# Altium footprint library LUMI_Standard_Auto_Soldering_LIB.PcbLib: 344 footprints (part 5 of 22)
Each footprint in its own frame and in the unit in brackets; x right, y up, seen from the top. Pads: shape width x height; smd on the part's side, far side on the other; paste and mask are expansions set on the pad; w line width, h text height; cw(c..) or ccw(c..) is an arc to the next point about the centre after c.
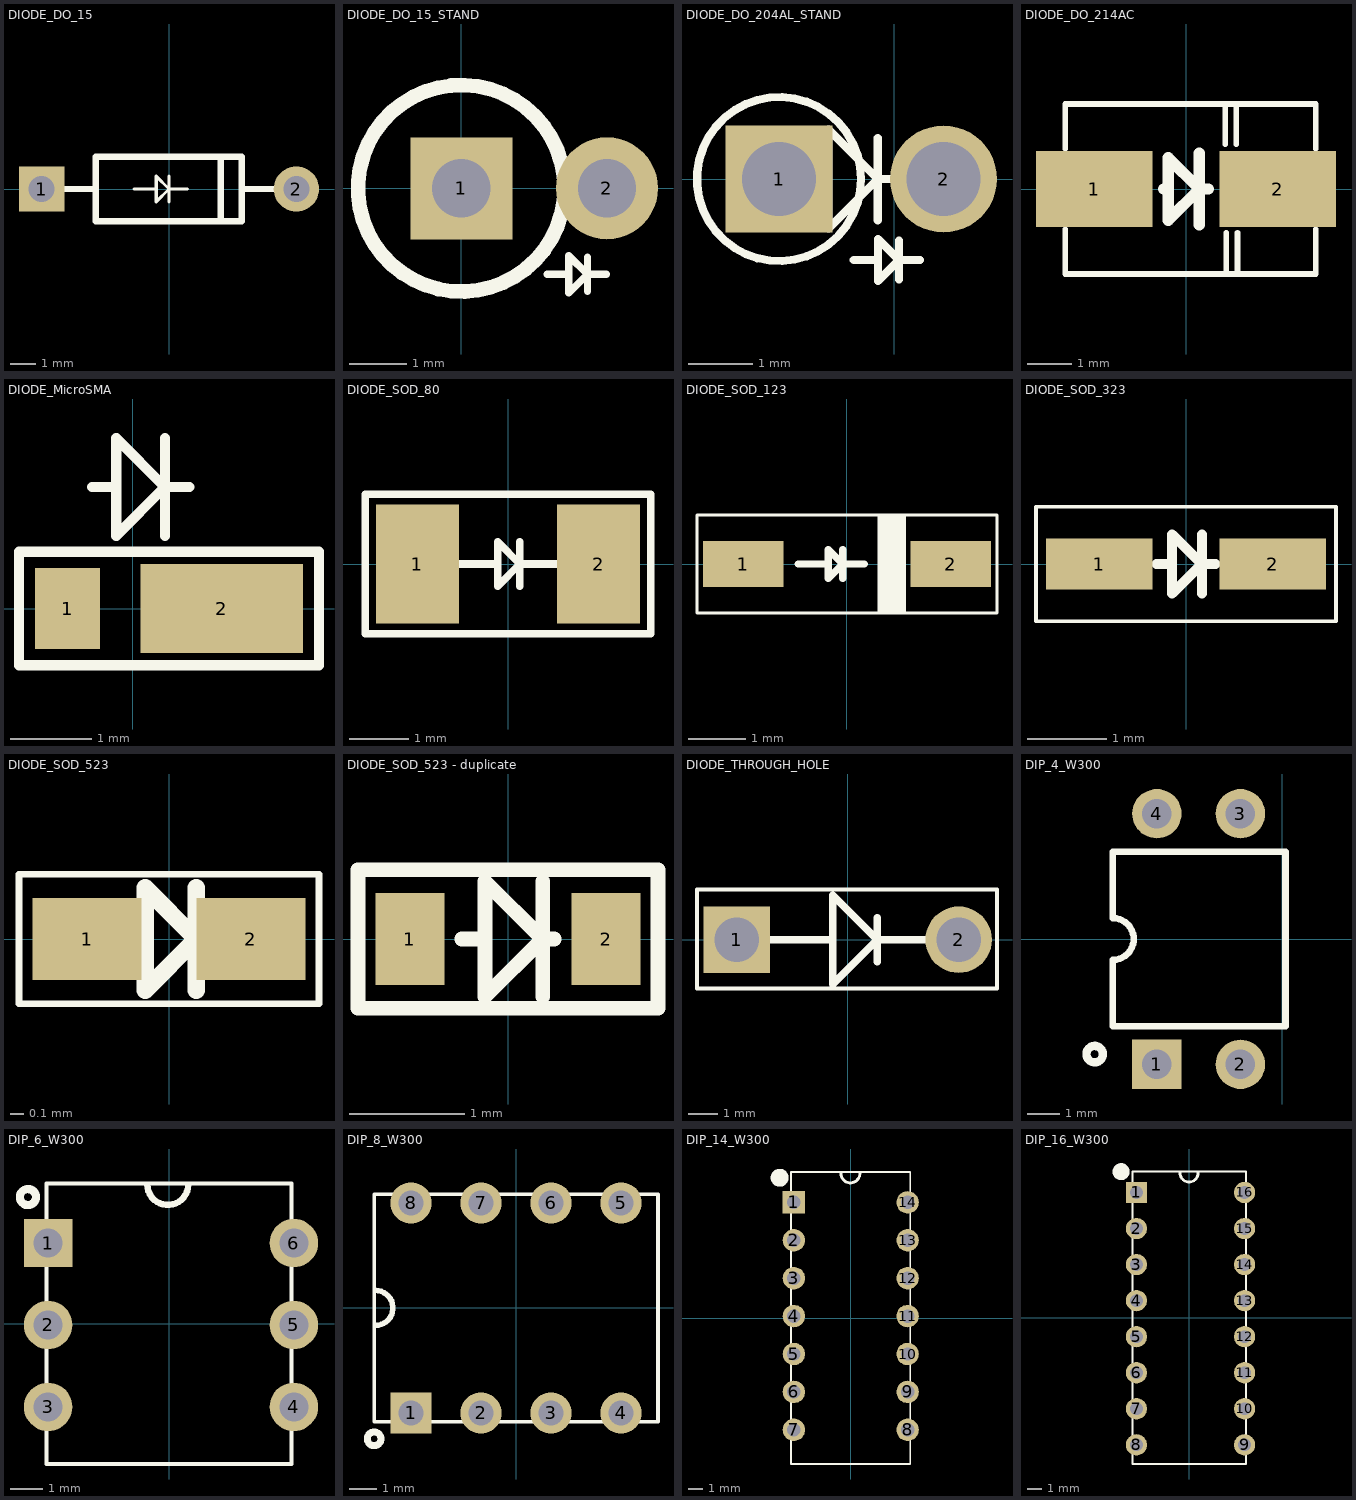
[diagram p4: the footprints below, top view; thin cyan lines are the x and y axes]

## DIODE_DO_15 [mil]
pads (2):
  rect 70x70 hole 40: 1(-196.85,0)
  round 70 hole 40: 2(196.85,0)
Top Overlay:
  lines w5: -54.13,0 -19.69,0 ; 0,-19.68 0,19.68 ; 28.54,0 0,0 ; -19.68,-19.68 0,0 ; -19.69,-19.68 -19.68,-19.68 ; -19.69,-19.68 -19.69,19.68 0,0 ; 0,0 0,0
  lines w10: -196.85,0 -113.19,0 ; 79.96,-50 79.96,50 ; 112.2,0 196.85,0 ; -113.19,-50 112.2,-50 112.2,50 -113.19,50 -113.19,-50

## DIODE_DO_15_STAND [mil]
pads (2):
  rect 70x70 hole 40: 1(0,0)
  round 70 hole 40: 2(100,0)
Top Overlay:
  circle w10: c0,0 r70.87
  lines w5: 59.06,-59.06 73.82,-59.06 ; 86.61,-70.87 86.61,-47.24 ; 99.41,-59.06 86.61,-59.06 ; 86.61,-59.06 73.82,-46.26 73.82,-71.85 86.61,-59.06
3D body: height 435.04, standoff -157.48, extent -70.07,-70.07 116.93,70.09

## DIODE_DO_204AL_STAND [mil]
pads (2):
  rect 65x65 hole 45: 1(-70,0)
  round 65 hole 45: 2(30,0)
Top Overlay:
  circle w5: c-70,0 r49.88
  lines w5: -70,0 -40,0 ; -24.61,-49.21 -9.84,-49.21 ; -10,-25 -10,25 ; 2.95,-61.02 2.95,-37.4 ; 15.75,-49.21 2.95,-49.21 ; 30,0 -10,0 ; -10,0 -40,30 -40,-30 -10,0 ; 2.95,-49.21 -9.84,-62.01 -9.84,-36.42 2.95,-49.21
3D body: height 280.46, standoff -50, extent -123,-55 45,50

## DIODE_DO_214AC [mm]
pads (2):
  rect 2.6x1.7 smd: 1(-2.05,0) 2(2.05,0)
Top Overlay:
  lines w0.127: -2.7,-0.9 -2.7,-1.9 2.9,-1.9 2.9,-0.9 ; -2.7,0.9 -2.7,1.9 2.9,1.9 2.9,0.9 ; -0.4,-0.7 0.3,0 -0.4,0.7 ; 0.875,1 0.875,1.9 ; 0.9,-1.9 0.9,-0.975 ; 1.125,1 1.125,1.9 ; 1.15,-1.9 1.15,-0.975
  lines w0.254: -0.5,0 -0.4,0 ; 0.3,-0.8 0.3,0.8 ; 0.5,0 0.3,0 ; 0.3,0 -0.4,-0.7 -0.4,0.7 0.3,0
3D body: height 2.4, standoff 0.1, extent -2.6,-1.8 2.8,1.8

## DIODE_MicroSMA [mm]
pads (2):
  rect 0.8x1 smd: 1(-0.8,0)
  rect 2x1.1 smd: 2(1.1,0)
Top Overlay:
  lines w0.127: -0.5,1.5 -0.2,1.5 ; 0.4,0.9 0.4,2.1 ; 0.7,1.5 0.4,1.5 ; -0.2,1.5 -0.2,2.1 0.4,1.5 ; -0.2,1.5 -0.2,0.9 0.4,1.5 ; -1.4,-0.7 -1.4,0.7 2.3,0.7 2.3,-0.7 -1.4,-0.7
3D body: height 0.74, standoff 0, extent 0.7,-0.6 0.9,0.6
3D body: height 0.1, standoff 0, extent -1.15,-0.4 -1.05,0.4
3D body: height 0.1, standoff 0, extent 1.05,-0.5 1.15,0.5
3D body: height 0.73, standoff 0, extent -1.05,-0.6 1.05,0.6

## DIODE_SOD_80 [mm] "Use for diode"
pads (2):
  rect 1.4x2 smd: 1(-1.524,0) 2(1.524,0)
Top Overlay:
  lines w0.127: -0.875,0 -0.175,0 ; 0.2,-0.375 0.2,0.375 ; 0.85,0 0.2,0 ; -0.175,0 -0.175,-0.375 0.2,0 ; -0.175,0 -0.175,0.375 0.2,0 ; -2.4,-1.175 -2.4,1.175 2.4,1.175 2.4,-1.175 -2.4,-1.175
3D body: height -0.39, standoff -1.84, extent -1.75,-0.725 1.75,0.725

## DIODE_SOD_123 [mm]
pads (2):
  rect 1.4x0.8 smd: 1(-1.8,0) 2(1.8,0)
Top Overlay:
  rectangle: 0.525,-0.85 1.025,0.825
  lines w0.05: -2.6,-0.85 -2.6,0.85 2.6,0.85 2.6,-0.85 -2.6,-0.85
  lines w0.127: -0.85,0 -0.325,0 ; -0.075,-0.25 -0.075,0.25 ; 0.3,0 -0.075,0 ; -0.075,0 -0.325,0.25 -0.325,-0.25 -0.075,0
3D body: height -0.46, standoff -1.73, extent -1.85,-0.8 1.85,0.8

## DIODE_SOD_323 [mm]
pads (2):
  rect 1.35x0.65 smd: 1(-1.1,0) 2(1.1,0)
Top Overlay:
  lines w0.05: -1.9,-0.725 1.9,-0.725 1.9,0.725 -1.9,0.725 -1.9,-0.725
  lines w0.127: -0.375,0 -0.175,0 ; 0.2,-0.375 0.2,0.375 ; 0.375,0 0.2,0 ; -0.175,0 -0.175,0.375 0.2,0 ; -0.175,0 -0.175,-0.375 0.2,0
3D body: height -0.41, standoff -1.51, extent -1.3,-0.675 1.3,0.675

## DIODE_SOD_523 [mm]
pads (2):
  rect 0.8x0.6 smd: 1(-0.6,0) 2(0.6,0)
Top Overlay:
  lines w0.05: -1.1,-0.475 -1.1,0.475 1.1,0.475 1.1,-0.475 -1.1,-0.475
  lines w0.127: -0.375,0 -0.175,0 ; 0.2,-0.375 0.2,0.375 ; 0.375,0 0.2,0 ; -0.175,0 -0.175,0.375 0.2,0 ; -0.175,0 -0.175,-0.375 0.2,0
3D body: height 0.2, standoff 0, extent 0.65,-0.125 0.9,0.125
3D body: height 0.2, standoff 0, extent -0.9,-0.125 -0.65,0.125
3D body: height 0.77, standoff 0, extent -0.65,-0.45 0.65,0.45
3D body: height 0.78, standoff 0, extent 0.425,-0.4 0.5,0.4

## DIODE_SOD_523 - duplicate [mm]
pads (2):
  rect 0.6x0.8 smd: 1(-0.85,0) 2(0.85,0)
Top Overlay:
  lines w0.127: -0.4,0 -0.2,0 ; 0.3,-0.5 0.3,0 ; 0.3,0.5 0.3,0 ; 0.4,0 0.3,0 ; -0.2,0 -0.2,0.5 0.3,0 ; -0.2,0 -0.2,-0.5 0.3,0 ; -1.3,-0.6 1.3,-0.6 1.3,0.6 -1.3,0.6 -1.3,-0.6
3D body: height 0.2, standoff 0, extent 0.65,-0.125 0.9,0.125
3D body: height 0.2, standoff 0, extent -0.9,-0.125 -0.65,0.125
3D body: height 0.77, standoff 0, extent -0.65,-0.45 0.65,0.45
3D body: height 0.78, standoff 0, extent 0.425,-0.4 0.5,0.4

## DIODE_THROUGH_HOLE [mil]
pads (2):
  rect 90x90 hole 60: 1(-150,0)
  round 90 hole 60: 2(150,0)
Top Overlay:
  lines w5: -203.74,-65.94 201.77,-65.94 201.77,67.91 -203.74,67.91 -203.74,-65.94
  lines w10: -140,0 -20,0 ; 40,-30 40,30 ; 150,0 40,0 ; 40,0 -20,60 -20,-60 40,0
3D body: height 125.98, standoff -133.86, extent -165.75,-61.98 165.75,64

## DIP_4_W300 [mm] "DIP; 8 Leads; Row Spacing 7.62 mm; Pitch 2.54 mm"
height 5.08
pads (4):
  rect 1.5x1.5 hole 0.9: 1(-3.81,-3.81)
  round 1.5 hole 0.9: 2(-1.27,-3.81) 3(-1.27,3.81) 4(-3.81,3.81)
Top Overlay:
  circle w0.254: c-5.7,-3.5 r0.25
  lines w0.2: -5.15,-2.65 -5.15,-0.635 ccw(c-5.15,0) -5.15,0.635 -5.15,2.65 0.102,2.65 0.102,-2.65 -5.15,-2.65
3D body: height 4.31, standoff -3.28, extent -5.258,-3.949 0.282,4.051

## DIP_6_W300 [mm]
pads (6):
  rect 1.5x1.5 hole 0.9: 1(-3.75,2.5)
  round 1.5 hole 0.9: 2(-3.75,-0.04) 3(-3.75,-2.58) 4(3.87,-2.58) 5(3.87,-0.04) 6(3.87,2.5)
Top Overlay:
  circle w0.254: c-4.375,3.925 r0.25
  lines w0.127: -3.8,-4.35 -3.8,4.35 3.8,4.35 3.8,-4.35 -3.8,-4.35
  lines w0.2: -0.675,4.315 ccw(c-0.04,4.315) 0.595,4.315
3D body: height 5.3, standoff -2, extent -3.935,-3.62 3.935,3.5

## DIP_8_W300 [mm] "DIP; 8 Leads; Row Spacing 7.62 mm; Pitch 2.54 mm"
height 5.08
pads (8):
  rect 1.5x1.5 hole 0.9: 1(-3.81,-3.81)
  round 1.5 hole 0.9: 2(-1.27,-3.81) 3(1.27,-3.81) 4(3.81,-3.81) 5(3.81,3.81) 6(1.27,3.81) 7(-1.27,3.81) 8(-3.81,3.81)
Top Overlay:
  circle w0.254: c-5.15,-4.75 r0.25
  lines w0.127: -5.15,-4.13 5.15,-4.13 5.15,4.13 -5.15,4.13 -5.15,-4.13
  lines w0.2: -5.1,-0.635 ccw(c-5.1,0) -5.1,0.635
3D body: height 5.08, standoff -3.5, extent -5.638,-3.96 5.282,3.91

## DIP_14_W300 [mm] "DIP, 40-Leads, Row Spacing 15.24mm, Pitch 2.54mm, Body 51.8x13.5mm"
height 6.35
pads (14):
  rect 1.5x1.5 hole 0.9: 1(-3.795,7.75)
  round 1.5 hole 0.9: 2(-3.795,5.21) 3(-3.795,2.67) 4(-3.795,0.13) 5(-3.795,-2.41) 6(-3.795,-4.95) 7(-3.795,-7.49) 8(3.825,-7.49) 9(3.825,-4.95) 10(3.825,-2.41) 11(3.825,0.13) 12(3.825,2.67) 13(3.825,5.21) 14(3.825,7.75)
Top Overlay:
  circle w0.6: c-4.75,9.4 r0.3
  lines w0.127: -4,-9.78 4,-9.78 4,9.78 -4,9.78 -4,-9.78
  lines w0.2: -0.645,9.685 ccw(c-0.01,9.685) 0.625,9.685
3D body: height 5.1, standoff -3.3, extent -3.91,-10 3.96,10

## DIP_16_W300 [mm] "DIP, 40-Leads, Row Spacing 15.24mm, Pitch 2.54mm, Body 51.8x13.5mm"
height 6.35
pads (16):
  rect 1.5x1.5 hole 0.9: 1(-3.72,8.83)
  round 1.5 hole 0.9: 2(-3.72,6.29) 3(-3.72,3.75) 4(-3.72,1.21) 5(-3.72,-1.33) 6(-3.72,-3.87) 7(-3.72,-6.41) 8(-3.72,-8.95) 9(3.9,-8.95) 10(3.9,-6.41) 11(3.9,-3.87) 12(3.9,-1.33) 13(3.9,1.21) 14(3.9,3.75) 15(3.9,6.29) 16(3.9,8.83)
Top Overlay:
  circle w0.6: c-4.8,10.3 r0.3
  lines w0.127: -4,-10.3 -4,10.3 4,10.3 4,-10.3 -4,-10.3
  lines w0.2: -0.645,10.203 ccw(c-0.01,10.203) 0.625,10.203
3D body: height 5.1, standoff -3.3, extent -3.82,-10.052 4.05,9.948